# Altium integrated library DIODES.IntLib: 28 symbols
Pins are listed as number, name and electrical type; pins without a type are passive.

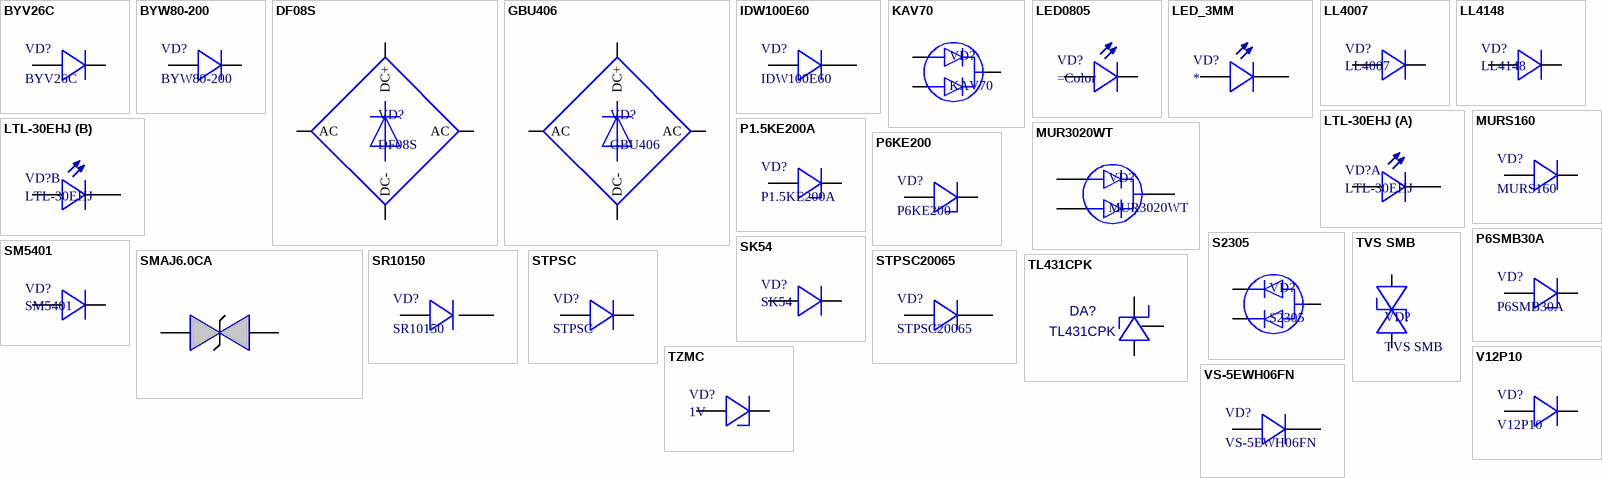
[diagram p0: symbols BYV26C to VS-5EWH06FN]

## BYV26C
designator VD?
ComponentDescription: BYV26C
footprint SOD-57
pins: A, K

## BYW80-200
designator VD?
Schottky; ComponentDescription: BYW80-200
footprint TO220-AC; pin to pad A>3 K>1
pins: A, K

## DF08S
designator VD?
ComponentDescription: DF08S
footprint DFS; pin to pad +>p ->n
pins: + DC+, - DC-, AC1 AC, AC2 AC

## GBU406
designator VD?
ComponentDescription: GBU406
footprint GBU406
pins: + DC+, - DC-, AC1 AC, AC2 AC

## IDW100E60
designator VD?
ComponentDescription: IDW100E60
footprint TO247-h20
pins: 2 K, 3 A

## KAV70
designator VD?
ComponentDescription: KAV70
footprint SOT95P230X110-3N (SOT23, 3-Leads, Body 2,90x2,30mm, Pitch 0,95mm, IPC Medium Density)
pins: 1 A, 2 A, 3 K

## LED0805
designator VD?
LED0805; ComponentDescription: LED0805 Green
footprint LED0805 (Chip Resistor, 2-Leads, Body 2,00x1,25mm, IPC Medium Density)
pins: A, K

## LED_3MM
designator VD?
SOD80; ComponentDescription: Светодиод 3мм; Color: *
footprint LED_3MM
pins: A, K

## LL4007
designator VD?
MELF (DO-213AB); ComponentDescription: LL4007
footprint DIOMELF5025N (MELF Diode, 2-Leads, Body 5,00x2,50mm, IPC Medium Density)
pins: A, K

## LL4148
designator VD?
SOD80; ComponentDescription: LL4148
footprint DIOMELF3515N (MELF Diode, 2-Leads, Body 3,50x1,45mm, IPC Medium Density)
pins: A, K

## LTL-30EHJ
designator VD?
Color: *; ComponentDescription: LTL-30EHJ
footprint 2 color led
part A pins: 1, 2
part B pins: 2, 3

## MUR3020WT
designator VD?
ComponentDescription: MUR3020WT
footprint TO247-h20
pins: 1 A, 2 K, 3 A

## MURS160
designator VD?
ComponentDescription: MURS160
footprint DIOM4336X24N (Molded Diode, 2-Leads, Body 4,33x3,65mm, IPC Medium Density)
pins: A, K

## P1.5KE200A
designator VD?
ComponentDescription: P1.5KE200A
footprint DO-201-200V
pins: 1 A, 2 K

## P6KE200
designator VD?
TVS diode; ComponentDescription: P6KE200
footprint DO-15-400
pins: 1 A, 2 K

## P6SMB30A
designator VD?
30V; ComponentDescription: P6SMB30A
footprint DIOM4336X24N (Molded Diode, 2-Leads, Body 4,33x3,65mm, IPC Medium Density); pin to pad 1>A 2>K
pins: 1 A, 2 K

## S2305
designator VD?
USB 5V TVS; ComponentDescription: S2305
footprint SOT95P230X110-3N (SOT23, 3-Leads, Body 2,90x2,30mm, Pitch 0,95mm, IPC Medium Density)
pins: 1 A, 2 A, 3 K

## SK54
designator VD?
ComponentDescription: SK54
footprint DIOM4336X24N (Molded Diode, 2-Leads, Body 4,33x3,65mm, IPC Medium Density)
pins: A, K

## SM5401
designator VD?
ComponentDescription: SM5401
footprint DIOMELF5025N (MELF Diode, 2-Leads, Body 5,00x2,50mm, IPC Medium Density); pin to pad 1>A 2>K
pins: 1 A, 2 K

## SMAJ6.0CA
designator VD?
VALUE: SMAJ6.0CA
footprint SMAxxCA
pins: 1, 2

## SR10150
designator VD?
Schottky; ComponentDescription: SR10150
footprint TO220-AC
pins: 1 K, 3 A

## STPSC
designator VD?
Silicon carbide diode; ComponentDescription: STPSC
footprint TO220-AC; pin to pad A>3 K>1
footprint TO220-RA-600B HV DIODE
pins: A, K

## STPSC20065
designator VD?
ComponentDescription: STPSC20065
footprint TO247-2-h20
pins: 1 K, 3 A

## TL431CPK
designator DA?
Value: *; ComponentDescription: TL431CPK
footprint SOT89-150P409X160-3N (SOT89, 3-Leads, Body 4,50x2,50mm, Pitch 1,50mm, Lead Span 4,1mm, IPC Medium Density)
pins: 1 R, 2 A, 3 K

## TVS SMB
designator VD?
ComponentDescription: TVS SMB
footprint DIOM4336X24N (Molded Diode, 2-Leads, Body 4,33x3,65mm, IPC Medium Density); pin to pad 1>A 2>K
pins: 1 A, 2 K

## TZMC
designator VD?, comment 1V
Zener; ComponentDescription: TZMC 1V; Value: 1V
footprint DIOMELF3515N (MELF Diode, 2-Leads, Body 3,50x1,45mm, IPC Medium Density)
pins: A, K

## V12P10
designator VD?
ComponentDescription: V12P10
footprint TO277A
pins: A, K

## VS-5EWH06FN
designator VD?
ComponentDescription: VS-5EWH06FN
footprint DPAK229P970X230-3N (D-PAK, 3-Pads, Body 6,20x6,71mm (max), IPC Medium Density)
pins: 2 K, 3 A